# Altium footprint library CONN_HDR_2.54MM_RA.PcbLib: 63 footprints (part 3 of 5)
Each footprint in its own frame and in the unit in brackets; x right, y up, seen from the top. Pads: shape width x height; smd on the part's side, far side on the other; paste and mask are expansions set on the pad; w line width, h text height; cw(c..) or ccw(c..) is an arc to the next point about the centre after c.
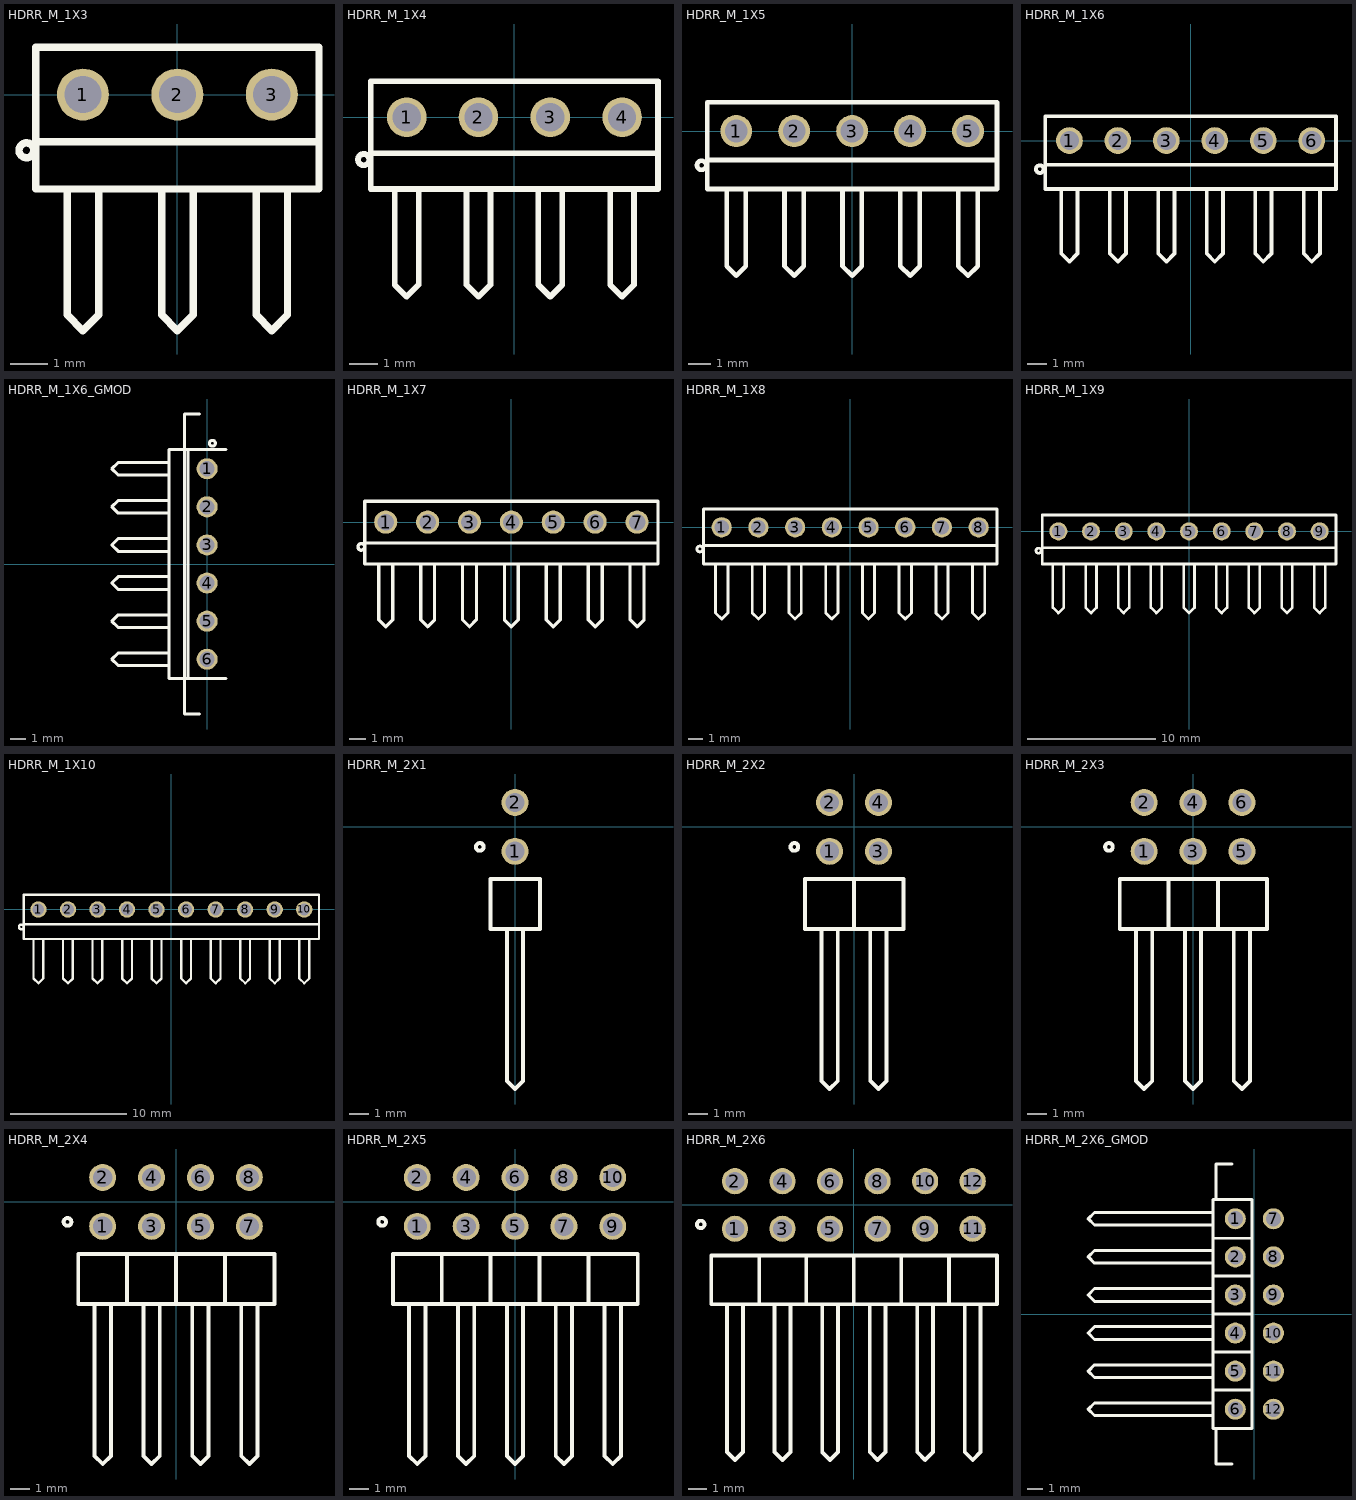
[diagram p2: the footprints below, top view; thin cyan lines are the x and y axes]

## HDRR_M_1X3 [mm] "Connector; Header; 3 Position; Right Angle"
height 12
pads (3):
  round 1.4 / inner round 1.4 / far side oval 1.4x2.2 hole 1: 1(-2.54,0) 2(0,0) 3(2.54,0)
Top Overlay:
  circle w0.2: c-4.06,-1.5 r0.2
  lines w0.2: -2.963,-2.54 -2.963,-5.927 -2.54,-6.35 -2.117,-5.927 -2.117,-2.54 ; -0.423,-2.54 -0.423,-5.927 0,-6.35 0.423,-5.927 0.423,-2.54 ; 2.117,-2.54 2.117,-5.927 2.54,-6.35 2.963,-5.927 2.963,-2.54 ; 3.81,-1.27 -3.81,-1.27 ; -3.81,-2.54 -3.81,1.27 ; -3.81,-2.54 3.81,-2.54 3.81,1.27 -3.81,1.27 ; -3.81,-2.54 -3.81,-1.27 ; -3.81,-1.27 -3.81,1.27
3D body "PLS-1R.step": height 5.45, standoff -3, extent 1.27,-7.35 3.81,1.27
3D body "PLS-1R.step": height 5.45, standoff -3, extent -1.27,-7.35 1.27,1.27
3D body "PLS-1R.step": height 5.45, standoff -3, extent -3.81,-7.35 -1.27,1.27

## HDRR_M_1X4 [mm] "Connector; Header; 4 Position; Right Angle"
height 12
pads (4):
  round 1.4 / inner round 1.4 / far side oval 1.4x2.2 hole 1: 1(-3.81,0) 2(-1.27,0) 3(1.27,0) 4(3.81,0)
Top Overlay:
  circle w0.2: c-5.33,-1.5 r0.2
  lines w0.2: -4.233,-2.54 -4.233,-5.927 -3.81,-6.35 -3.387,-5.927 -3.387,-2.54 ; -1.693,-2.54 -1.693,-5.927 -1.27,-6.35 -0.847,-5.927 -0.847,-2.54 ; 0.847,-2.54 0.847,-5.927 1.27,-6.35 1.693,-5.927 1.693,-2.54 ; 3.387,-2.54 3.387,-5.927 3.81,-6.35 4.233,-5.927 4.233,-2.54 ; -5.08,-1.27 -5.08,1.27 5.08,1.27 5.08,-1.27 ; -5.08,-1.27 5.08,-1.27 ; -5.08,-1.27 5.08,-1.27 ; -5.08,-1.27 -5.08,-2.54 5.08,-2.54 5.08,-1.27
3D body "PLS-1R.step": height 5.45, standoff -3, extent -5.08,-7.35 -2.54,1.27
3D body "PLS-1R.step": height 5.45, standoff -3, extent -2.54,-7.35 0,1.27
3D body "PLS-1R.step": height 5.45, standoff -3, extent 0,-7.35 2.54,1.27
3D body "PLS-1R.step": height 5.45, standoff -3, extent 2.54,-7.35 5.08,1.27

## HDRR_M_1X5 [mm] "Connector; Header; 5 Position"
pads (5):
  round 1.4 / inner round 1.4 / far side oval 1.4x2.2 hole 1 mask+0.1: 1(-5.08,0) 2(-2.54,0) 3(0,0) 4(2.54,0) 5(5.08,0)
Top Overlay:
  circle w0.2: c-6.6,-1.5 r0.2
  lines w0.2: -5.503,-2.54 -5.503,-5.927 -5.08,-6.35 -4.657,-5.927 -4.657,-2.54 ; -2.963,-2.54 -2.963,-5.927 -2.54,-6.35 -2.117,-5.927 -2.117,-2.54 ; -0.423,-2.54 -0.423,-5.927 0,-6.35 0.423,-5.927 0.423,-2.54 ; 2.117,-2.54 2.117,-5.927 2.54,-6.35 2.963,-5.927 2.963,-2.54 ; 4.657,-2.54 4.657,-5.927 5.08,-6.35 5.503,-5.927 5.503,-2.54 ; 6.35,-1.27 -6.35,-1.27 ; -6.35,-2.54 -6.35,1.27 ; -6.35,-2.54 6.35,-2.54 6.35,1.27 -6.35,1.27 ; -6.35,-2.54 -6.35,-1.27 ; -6.35,-1.27 -6.35,1.27
3D body "PLS-1R.step": height 5.45, standoff -3, extent 3.81,-7.35 6.35,1.27
3D body "PLS-1R.step": height 5.45, standoff -3, extent 1.27,-7.35 3.81,1.27
3D body "PLS-1R.step": height 5.45, standoff -3, extent -1.27,-7.35 1.27,1.27
3D body "PLS-1R.step": height 5.45, standoff -3, extent -3.81,-7.35 -1.27,1.27
3D body "PLS-1R.step": height 5.45, standoff -3, extent -6.35,-7.35 -3.81,1.27

## HDRR_M_1X6 [mm] "Connector; Header; 6 Position"
pads (6):
  round 1.4 / inner round 1.4 / far side oval 1.4x2.2 hole 1 mask+0.1: 1(-6.35,0) 2(-3.81,0) 3(-1.27,0) 4(1.27,0) 5(3.81,0) 6(6.35,0)
Top Overlay:
  circle w0.2: c-7.9,-1.5 r0.2
  lines w0.2: -6.773,-2.54 -6.773,-5.927 -6.35,-6.35 -5.927,-5.927 -5.927,-2.54 ; -4.233,-2.54 -4.233,-5.927 -3.81,-6.35 -3.387,-5.927 -3.387,-2.54 ; -1.693,-2.54 -1.693,-5.927 -1.27,-6.35 -0.847,-5.927 -0.847,-2.54 ; 0.847,-2.54 0.847,-5.927 1.27,-6.35 1.693,-5.927 1.693,-2.54 ; 3.387,-2.54 3.387,-5.927 3.81,-6.35 4.233,-5.927 4.233,-2.54 ; 5.927,-2.54 5.927,-5.927 6.35,-6.35 6.773,-5.927 6.773,-2.54 ; -7.62,-1.27 -7.62,1.27 7.62,1.27 7.62,-1.27 ; -7.62,-1.27 7.62,-1.27 ; -7.62,-1.27 -7.62,-2.54 7.62,-2.54 7.62,-1.27
3D body "PLS-1R.step": height 5.45, standoff -3, extent 5.08,-7.35 7.62,1.27
3D body "PLS-1R.step": height 5.45, standoff -3, extent 2.54,-7.35 5.08,1.27
3D body "PLS-1R.step": height 5.45, standoff -3, extent 0,-7.35 2.54,1.27
3D body "PLS-1R.step": height 5.45, standoff -3, extent -2.54,-7.35 0,1.27
3D body "PLS-1R.step": height 5.45, standoff -3, extent -5.08,-7.35 -2.54,1.27
3D body "PLS-1R.step": height 5.45, standoff -3, extent -7.62,-7.35 -5.08,1.27

## HDRR_M_1X6_GMOD [mm] "Connector; Header; 6 Position"
pads (6):
  round 1.4 / inner round 1.4 / far side oval 2x1.4 hole 1 mask+0.1: 1(0,6.35) 2(0,3.81) 3(0,1.27) 4(0,-1.27) 5(0,-3.81) 6(0,-6.35)
Top Overlay:
  circle w0.2: c0.35,8.05 r0.2
  lines w0.2: -2.54,-6.773 -5.927,-6.773 -6.35,-6.35 -5.927,-5.927 -2.54,-5.927 ; -2.54,-4.233 -5.927,-4.233 -6.35,-3.81 -5.927,-3.387 -2.54,-3.387 ; -2.54,-1.693 -5.927,-1.693 -6.35,-1.27 -5.927,-0.847 -2.54,-0.847 ; -2.54,0.847 -5.927,0.847 -6.35,1.27 -5.927,1.693 -2.54,1.693 ; -2.54,3.387 -5.927,3.387 -6.35,3.81 -5.927,4.233 -2.54,4.233 ; -2.54,5.927 -5.927,5.927 -6.35,6.35 -5.927,6.773 -2.54,6.773 ; -0.5,-10 -1.5,-10 -1.5,10 -0.5,10 ; 1.27,-7.62 -1.27,-7.62 ; 1.27,7.62 -1.27,7.62 ; -1.27,-7.62 -1.27,7.62 ; -1.27,-7.62 -2.54,-7.62 -2.54,7.62 -1.27,7.62
3D body "PLS-1R.step": height 5.45, standoff -3, extent -7.358,-7.62 1.262,-5.08
3D body "PLS-1R.step": height 5.45, standoff -3, extent -7.358,-5.08 1.262,-2.54
3D body "PLS-1R.step": height 5.45, standoff -3, extent -7.358,0 1.262,2.54
3D body "PLS-1R.step": height 5.45, standoff -3, extent -7.358,-2.54 1.262,0
3D body "PLS-1R.step": height 5.45, standoff -3, extent -7.358,2.54 1.262,5.08
3D body "PLS-1R.step": height 5.45, standoff -3, extent -7.358,5.08 1.262,7.62

## HDRR_M_1X7 [mm] "Connector; Header; 7 Position"
pads (7):
  round 1.4 / inner round 1.4 / far side oval 1.4x2.2 hole 1 mask+0.1: 1(-7.62,0) 2(-5.08,0) 3(-2.54,0) 4(0,0) 5(2.54,0) 6(5.08,0) 7(7.62,0)
Top Overlay:
  circle w0.2: c-9.1,-1.5 r0.2
  lines w0.2: -8.043,-2.54 -8.043,-5.927 -7.62,-6.35 -7.197,-5.927 -7.197,-2.54 ; -5.503,-2.54 -5.503,-5.927 -5.08,-6.35 -4.657,-5.927 -4.657,-2.54 ; -2.963,-2.54 -2.963,-5.927 -2.54,-6.35 -2.117,-5.927 -2.117,-2.54 ; -0.423,-2.54 -0.423,-5.927 0,-6.35 0.423,-5.927 0.423,-2.54 ; 2.117,-2.54 2.117,-5.927 2.54,-6.35 2.963,-5.927 2.963,-2.54 ; 4.657,-2.54 4.657,-5.927 5.08,-6.35 5.503,-5.927 5.503,-2.54 ; 7.197,-2.54 7.197,-5.927 7.62,-6.35 8.043,-5.927 8.043,-2.54 ; 8.89,-1.27 -8.89,-1.27 ; -8.89,-2.54 -8.89,-1.27 ; -8.89,-2.54 8.89,-2.54 8.89,1.27 -8.89,1.27 ; -8.89,-2.54 -8.89,1.27 ; -8.89,-1.27 -8.89,1.27
3D body "PLS-1R.step": height 5.45, standoff -3, extent 6.35,-7.35 8.89,1.27
3D body "PLS-1R.step": height 5.45, standoff -3, extent 3.81,-7.35 6.35,1.27
3D body "PLS-1R.step": height 5.45, standoff -3, extent 1.27,-7.35 3.81,1.27
3D body "PLS-1R.step": height 5.45, standoff -3, extent -1.27,-7.35 1.27,1.27
3D body "PLS-1R.step": height 5.45, standoff -3, extent -3.81,-7.35 -1.27,1.27
3D body "PLS-1R.step": height 5.45, standoff -3, extent -6.35,-7.35 -3.81,1.27
3D body "PLS-1R.step": height 5.45, standoff -3, extent -8.89,-7.35 -6.35,1.27

## HDRR_M_1X8 [mm] "Connector; Header; 8 Position"
pads (8):
  round 1.4 / inner round 1.4 / far side oval 1.4x2.2 hole 1 mask+0.1: 1(-8.89,0) 2(-6.35,0) 3(-3.81,0) 4(-1.27,0) 5(1.27,0) 6(3.81,0) 7(6.35,0) 8(8.89,0)
Top Overlay:
  circle w0.2: c-10.4,-1.5 r0.2
  lines w0.2: -9.313,-2.54 -9.313,-5.927 -8.89,-6.35 -8.467,-5.927 -8.467,-2.54 ; -6.773,-2.54 -6.773,-5.927 -6.35,-6.35 -5.927,-5.927 -5.927,-2.54 ; -4.233,-2.54 -4.233,-5.927 -3.81,-6.35 -3.387,-5.927 -3.387,-2.54 ; -1.693,-2.54 -1.693,-5.927 -1.27,-6.35 -0.847,-5.927 -0.847,-2.54 ; 0.847,-2.54 0.847,-5.927 1.27,-6.35 1.693,-5.927 1.693,-2.54 ; 3.387,-2.54 3.387,-5.927 3.81,-6.35 4.233,-5.927 4.233,-2.54 ; 5.927,-2.54 5.927,-5.927 6.35,-6.35 6.773,-5.927 6.773,-2.54 ; 8.467,-2.54 8.467,-5.927 8.89,-6.35 9.313,-5.927 9.313,-2.54 ; -10.16,-1.27 -10.16,-2.54 10.16,-2.54 10.16,-1.27 ; -10.16,-1.27 10.16,-1.27 ; -10.16,-1.27 -10.16,1.27 10.16,1.27 10.16,-1.27
3D body "PLS-1R.step": height 5.45, standoff -3, extent 7.62,-7.35 10.16,1.27
3D body "PLS-1R.step": height 5.45, standoff -3, extent 5.08,-7.35 7.62,1.27
3D body "PLS-1R.step": height 5.45, standoff -3, extent 2.54,-7.35 5.08,1.27
3D body "PLS-1R.step": height 5.45, standoff -3, extent 0,-7.35 2.54,1.27
3D body "PLS-1R.step": height 5.45, standoff -3, extent -2.54,-7.35 0,1.27
3D body "PLS-1R.step": height 5.45, standoff -3, extent -5.08,-7.35 -2.54,1.27
3D body "PLS-1R.step": height 5.45, standoff -3, extent -7.62,-7.35 -5.08,1.27
3D body "PLS-1R.step": height 5.45, standoff -3, extent -10.16,-7.35 -7.62,1.27

## HDRR_M_1X9 [mm] "Connector; Header; 9 Position"
pads (9):
  round 1.4 / inner round 1.4 / far side oval 1.4x2.2 hole 1 mask+0.1: 1(-10.16,0) 2(-7.62,0) 3(-5.08,0) 4(-2.54,0) 5(0,0) 6(2.54,0) 7(5.08,0) 8(7.62,0) 9(10.16,0)
Top Overlay:
  circle w0.2: c-11.7,-1.5 r0.2
  lines w0.2: -10.583,-2.54 -10.583,-5.927 -10.16,-6.35 -9.737,-5.927 -9.737,-2.54 ; -8.043,-2.54 -8.043,-5.927 -7.62,-6.35 -7.197,-5.927 -7.197,-2.54 ; -5.503,-2.54 -5.503,-5.927 -5.08,-6.35 -4.657,-5.927 -4.657,-2.54 ; -2.963,-2.54 -2.963,-5.927 -2.54,-6.35 -2.117,-5.927 -2.117,-2.54 ; -0.423,-2.54 -0.423,-5.927 0,-6.35 0.423,-5.927 0.423,-2.54 ; 2.117,-2.54 2.117,-5.927 2.54,-6.35 2.963,-5.927 2.963,-2.54 ; 4.657,-2.54 4.657,-5.927 5.08,-6.35 5.503,-5.927 5.503,-2.54 ; 7.197,-2.54 7.197,-5.927 7.62,-6.35 8.043,-5.927 8.043,-2.54 ; 9.737,-2.54 9.737,-5.927 10.16,-6.35 10.583,-5.927 10.583,-2.54 ; 11.43,-1.27 -11.43,-1.27 ; -11.43,-2.54 -11.43,-1.27 ; -11.43,-2.54 11.43,-2.54 11.43,1.27 -11.43,1.27 ; -11.43,-2.54 -11.43,1.27 ; -11.43,-1.27 -11.43,1.27
3D body "PLS-1R.step": height 5.45, standoff -3, extent 8.89,-7.35 11.43,1.27
3D body "PLS-1R.step": height 5.45, standoff -3, extent 6.35,-7.35 8.89,1.27
3D body "PLS-1R.step": height 5.45, standoff -3, extent 3.81,-7.35 6.35,1.27
3D body "PLS-1R.step": height 5.45, standoff -3, extent 1.27,-7.35 3.81,1.27
3D body "PLS-1R.step": height 5.45, standoff -3, extent -1.27,-7.35 1.27,1.27
3D body "PLS-1R.step": height 5.45, standoff -3, extent -3.81,-7.35 -1.27,1.27
3D body "PLS-1R.step": height 5.45, standoff -3, extent -6.35,-7.35 -3.81,1.27
3D body "PLS-1R.step": height 5.45, standoff -3, extent -8.89,-7.35 -6.35,1.27
3D body "PLS-1R.step": height 5.45, standoff -3, extent -11.43,-7.35 -8.89,1.27

## HDRR_M_1X10 [mm] "Connector; Header; 10 Position"
pads (10):
  round 1.4 / inner round 1.4 / far side oval 1.4x2.2 hole 1 mask+0.1: 1(-11.43,0) 2(-8.89,0) 3(-6.35,0) 4(-3.81,0) 5(-1.27,0) 6(1.27,0) 7(3.81,0) 8(6.35,0) 9(8.89,0) 10(11.43,0)
Top Overlay:
  circle w0.2: c-12.9,-1.5 r0.2
  lines w0.2: -11.853,-2.54 -11.853,-5.927 -11.43,-6.35 -11.007,-5.927 -11.007,-2.54 ; -9.313,-2.54 -9.313,-5.927 -8.89,-6.35 -8.467,-5.927 -8.467,-2.54 ; -6.773,-2.54 -6.773,-5.927 -6.35,-6.35 -5.927,-5.927 -5.927,-2.54 ; -4.233,-2.54 -4.233,-5.927 -3.81,-6.35 -3.387,-5.927 -3.387,-2.54 ; -1.693,-2.54 -1.693,-5.927 -1.27,-6.35 -0.847,-5.927 -0.847,-2.54 ; 0.847,-2.54 0.847,-5.927 1.27,-6.35 1.693,-5.927 1.693,-2.54 ; 3.387,-2.54 3.387,-5.927 3.81,-6.35 4.233,-5.927 4.233,-2.54 ; 5.927,-2.54 5.927,-5.927 6.35,-6.35 6.773,-5.927 6.773,-2.54 ; 8.467,-2.54 8.467,-5.927 8.89,-6.35 9.313,-5.927 9.313,-2.54 ; 11.007,-2.54 11.007,-5.927 11.43,-6.35 11.853,-5.927 11.853,-2.54 ; -12.7,-1.27 -12.7,-2.54 12.7,-2.54 12.7,-1.27 ; -12.7,-1.27 12.7,-1.27 ; -12.7,-1.27 -12.7,1.27 12.7,1.27 12.7,-1.27
3D body "PLS-1R.step": height 5.45, standoff -3, extent -7.62,-7.35 -5.08,1.27
3D body "PLS-1R.step": height 5.45, standoff -3, extent -10.16,-7.35 -7.62,1.27
3D body "PLS-1R.step": height 5.45, standoff -3, extent -12.7,-7.35 -10.16,1.27
3D body "PLS-1R.step": height 5.45, standoff -3, extent -5.08,-7.35 -2.54,1.27
3D body "PLS-1R.step": height 5.45, standoff -3, extent -2.54,-7.35 0,1.27
3D body "PLS-1R.step": height 5.45, standoff -3, extent 0,-7.35 2.54,1.27
3D body "PLS-1R.step": height 5.45, standoff -3, extent 2.54,-7.35 5.08,1.27
3D body "PLS-1R.step": height 5.45, standoff -3, extent 5.08,-7.35 7.62,1.27
3D body "PLS-1R.step": height 5.45, standoff -3, extent 7.62,-7.35 10.16,1.27
3D body "PLS-1R.step": height 5.45, standoff -3, extent 10.16,-7.35 12.7,1.27

## HDRR_M_2X1 [mm] "Connector; Header; 2x2 Position"
height 7
pads (2):
  round 1.4 / inner round 1.4 / far side oval 1.4x2.2 hole 1: 1(0,-1.27) 2(0,1.27)
Top Overlay:
  circle w0.2: c-1.83,-1.04 r0.2
  lines w0.2: -0.423,-5.31 -0.423,-13.197 0,-13.62 0.423,-13.197 0.423,-5.31 ; -1.27,-5.31 1.3,-5.31 1.3,-2.7 -1.27,-2.7 -1.27,-5.31
3D body "2x1 Male Pin Header Angle.STEP": height 5.04, standoff -2.96, extent -1.275,-13.34 1.27,1.56

## HDRR_M_2X2 [mm] "Connector; Header; 2x2 Position"
height 7
pads (4):
  round 1.4 / inner round 1.4 / far side oval 1.4x2.2 hole 1: 1(-1.27,-1.27) 2(-1.27,1.27) 3(1.27,-1.27) 4(1.27,1.27)
Top Overlay:
  circle w0.2: c-3.1,-1.04 r0.2
  lines w0.2: -1.693,-5.31 -1.693,-13.197 -1.27,-13.62 -0.847,-13.197 -0.847,-5.31 ; 0.03,-5.31 -2.54,-5.31 -2.54,-2.7 0.03,-2.7 ; 0.847,-5.31 0.847,-13.197 1.27,-13.62 1.693,-13.197 1.693,-5.31 ; 0,-5.31 0,-2.7 2.57,-2.7 2.57,-5.31 0,-5.31
3D body "2x1 Male Pin Header Angle.STEP": height 5.04, standoff -2.96, extent -0.005,-13.34 2.54,1.56
3D body "2x1 Male Pin Header Angle.STEP": height 5.04, standoff -2.96, extent -2.545,-13.34 0,1.56

## HDRR_M_2X3 [mm] "Connector; Header; 3x2 Position"
height 7
pads (6):
  round 1.4 / inner round 1.4 / far side oval 1.4x2.2 hole 1: 1(-2.54,-1.27) 2(-2.54,1.27) 3(0,-1.27) 4(0,1.27) 5(2.54,-1.27) 6(2.54,1.27)
Top Overlay:
  circle w0.2: c-4.37,-1.04 r0.2
  lines w0.2: -2.963,-5.31 -2.963,-13.197 -2.54,-13.62 -2.117,-13.197 -2.117,-5.31 ; -1.24,-5.31 -3.81,-5.31 -3.81,-2.7 -1.24,-2.7 ; -0.423,-5.31 -0.423,-13.197 0,-13.62 0.423,-13.197 0.423,-5.31 ; 1.27,-5.31 3.84,-5.31 3.84,-2.7 1.27,-2.7 ; 2.117,-5.31 2.117,-13.197 2.54,-13.62 2.963,-13.197 2.963,-5.31 ; -1.27,-5.31 -1.27,-2.7 1.3,-2.7 1.3,-5.31 -1.27,-5.31
3D body "2x1 Male Pin Header Angle.STEP": height 5.04, standoff -2.96, extent 1.265,-13.34 3.81,1.56
3D body "2x1 Male Pin Header Angle.STEP": height 5.04, standoff -2.96, extent -1.275,-13.34 1.27,1.56
3D body "2x1 Male Pin Header Angle.STEP": height 5.04, standoff -2.96, extent -3.815,-13.34 -1.27,1.56

## HDRR_M_2X4 [mm] "Connector; Header; 4x2 Position"
height 7
pads (8):
  round 1.4 / inner round 1.4 / far side oval 1.4x2.2 hole 1: 1(-3.81,-1.27) 2(-3.81,1.27) 3(-1.27,-1.27) 4(-1.27,1.27) 5(1.27,-1.27) 6(1.27,1.27) 7(3.81,-1.27) 8(3.81,1.27)
Top Overlay:
  circle w0.2: c-5.64,-1.04 r0.2
  lines w0.2: -4.233,-5.31 -4.233,-13.197 -3.81,-13.62 -3.387,-13.197 -3.387,-5.31 ; -2.51,-5.31 -5.08,-5.31 -5.08,-2.7 -2.51,-2.7 ; -1.693,-5.31 -1.693,-13.197 -1.27,-13.62 -0.847,-13.197 -0.847,-5.31 ; 0.03,-5.31 -2.54,-5.31 -2.54,-2.7 0.03,-2.7 ; 0.847,-5.31 0.847,-13.197 1.27,-13.62 1.693,-13.197 1.693,-5.31 ; 2.57,-5.31 0,-5.31 0,-2.7 2.57,-2.7 ; 3.387,-5.31 3.387,-13.197 3.81,-13.62 4.233,-13.197 4.233,-5.31 ; 2.54,-5.31 2.54,-2.7 5.11,-2.7 5.11,-5.31 2.54,-5.31
3D body "2x1 Male Pin Header Angle.STEP": height 5.04, standoff -2.96, extent 2.535,-13.34 5.08,1.56
3D body "2x1 Male Pin Header Angle.STEP": height 5.04, standoff -2.96, extent -0.005,-13.34 2.54,1.56
3D body "2x1 Male Pin Header Angle.STEP": height 5.04, standoff -2.96, extent -2.545,-13.34 0,1.56
3D body "2x1 Male Pin Header Angle.STEP": height 5.04, standoff -2.96, extent -5.085,-13.34 -2.54,1.56

## HDRR_M_2X5 [mm] "Connector; Header; 5x2 Position"
height 7
pads (10):
  round 1.4 / inner round 1.4 / far side oval 1.4x2.2 hole 1: 1(-5.08,-1.27) 2(-5.08,1.27) 3(-2.54,-1.27) 4(-2.54,1.27) 5(0,-1.27) 6(0,1.27) 7(2.54,-1.27) 8(2.54,1.27) 9(5.08,-1.27) 10(5.08,1.27)
Top Overlay:
  circle w0.2: c-6.91,-1.04 r0.2
  lines w0.2: -5.503,-5.31 -5.503,-13.197 -5.08,-13.62 -4.657,-13.197 -4.657,-5.31 ; -3.78,-5.31 -6.35,-5.31 -6.35,-2.7 -3.78,-2.7 ; -2.963,-5.31 -2.963,-13.197 -2.54,-13.62 -2.117,-13.197 -2.117,-5.31 ; -1.24,-5.31 -3.81,-5.31 -3.81,-2.7 -1.24,-2.7 ; -0.423,-5.31 -0.423,-13.197 0,-13.62 0.423,-13.197 0.423,-5.31 ; 1.3,-5.31 -1.27,-5.31 -1.27,-2.7 1.3,-2.7 ; 2.117,-5.31 2.117,-13.197 2.54,-13.62 2.963,-13.197 2.963,-5.31 ; 3.84,-5.31 1.27,-5.31 1.27,-2.7 3.84,-2.7 ; 4.657,-5.31 4.657,-13.197 5.08,-13.62 5.503,-13.197 5.503,-5.31 ; 3.81,-5.31 3.81,-2.7 6.38,-2.7 6.38,-5.31 3.81,-5.31
3D body "2x1 Male Pin Header Angle.STEP": height 5.04, standoff -2.96, extent 3.805,-13.34 6.35,1.56
3D body "2x1 Male Pin Header Angle.STEP": height 5.04, standoff -2.96, extent 1.265,-13.34 3.81,1.56
3D body "2x1 Male Pin Header Angle.STEP": height 5.04, standoff -2.96, extent -1.275,-13.34 1.27,1.56
3D body "2x1 Male Pin Header Angle.STEP": height 5.04, standoff -2.96, extent -3.815,-13.34 -1.27,1.56
3D body "2x1 Male Pin Header Angle.STEP": height 5.04, standoff -2.96, extent -6.355,-13.34 -3.81,1.56

## HDRR_M_2X6 [mm] "Connector; Header; 6x2 Position"
height 7
pads (12):
  round 1.4 / inner round 1.4 / far side oval 1.4x2.2 hole 1: 1(-6.35,-1.27) 2(-6.35,1.27) 3(-3.81,-1.27) 4(-3.81,1.27) 5(-1.27,-1.27) 6(-1.27,1.27) 7(1.27,-1.27) 8(1.27,1.27) 9(3.81,-1.27) 10(3.81,1.27) 11(6.35,-1.27) 12(6.35,1.27)
Top Overlay:
  circle w0.2: c-8.18,-1.04 r0.2
  lines w0.2: -6.773,-5.31 -6.773,-13.197 -6.35,-13.62 -5.927,-13.197 -5.927,-5.31 ; -5.08,-5.31 -2.51,-5.31 ; -5.08,-2.7 -2.51,-2.7 ; -4.233,-5.31 -4.233,-13.197 -3.81,-13.62 -3.387,-13.197 -3.387,-5.31 ; -1.693,-5.31 -1.693,-13.197 -1.27,-13.62 -0.847,-13.197 -0.847,-5.31 ; 0.03,-5.31 -2.54,-5.31 -2.54,-2.7 0.03,-2.7 ; 0.847,-5.31 0.847,-13.197 1.27,-13.62 1.693,-13.197 1.693,-5.31 ; 2.57,-5.31 0,-5.31 0,-2.7 2.57,-2.7 ; 3.387,-5.31 3.387,-13.197 3.81,-13.62 4.233,-13.197 4.233,-5.31 ; 5.11,-5.31 2.54,-5.31 2.54,-2.7 5.11,-2.7 ; 5.927,-5.31 5.927,-13.197 6.35,-13.62 6.773,-13.197 6.773,-5.31 ; -7.62,-5.31 -5.05,-5.31 -5.05,-2.7 -7.62,-2.7 -7.62,-5.31 ; 5.08,-5.31 7.65,-5.31 7.65,-2.7 5.08,-2.7 5.08,-5.31
3D body "2x1 Male Pin Header Angle.STEP": height 5.04, standoff -2.96, extent -7.625,-13.34 -5.08,1.56
3D body "2x1 Male Pin Header Angle.STEP": height 5.04, standoff -2.96, extent -5.085,-13.34 -2.54,1.56
3D body "2x1 Male Pin Header Angle.STEP": height 5.04, standoff -2.96, extent -2.545,-13.34 0,1.56
3D body "2x1 Male Pin Header Angle.STEP": height 5.04, standoff -2.96, extent -0.005,-13.34 2.54,1.56
3D body "2x1 Male Pin Header Angle.STEP": height 5.04, standoff -2.96, extent 2.535,-13.34 5.08,1.56
3D body "2x1 Male Pin Header Angle.STEP": height 5.04, standoff -2.96, extent 5.075,-13.34 7.62,1.56

## HDRR_M_2X6_GMOD [mm] "Connector; Header; 2x6 Position"
pads (12):
  round 1.4 / inner round 1.4 / far side oval 1.8x1.4 hole 1: 1(-1.27,6.35) 2(-1.27,3.81) 3(-1.27,1.27) 4(-1.27,-1.27) 5(-1.27,-3.81) 6(-1.27,-6.35) 7(1.27,6.35) 8(1.27,3.81) 9(1.27,1.27) 10(1.27,-1.27) 11(1.27,-3.81) 12(1.27,-6.35)
Top Overlay:
  lines w0.2: -2.77,-6.773 -10.657,-6.773 -11.08,-6.35 -10.657,-5.927 -2.77,-5.927 ; -2.77,-5.11 -2.77,-2.54 -0.16,-2.54 -0.16,-5.11 ; -2.77,-4.233 -10.657,-4.233 -11.08,-3.81 -10.657,-3.387 -2.77,-3.387 ; -2.77,-2.57 -2.77,0 -0.16,0 -0.16,-2.57 ; -2.77,-1.693 -10.657,-1.693 -11.08,-1.27 -10.657,-0.847 -2.77,-0.847 ; -2.77,-0.03 -2.77,2.54 -0.16,2.54 -0.16,-0.03 ; -2.77,0.847 -10.657,0.847 -11.08,1.27 -10.657,1.693 -2.77,1.693 ; -2.77,2.51 -2.77,5.08 ; -2.77,3.387 -10.657,3.387 -11.08,3.81 -10.657,4.233 -2.77,4.233 ; -2.77,5.927 -10.657,5.927 -11.08,6.35 -10.657,6.773 -2.77,6.773 ; -2.54,-7.65 -2.54,-10 -1.5,-10 ; -2.54,7.62 -2.54,10 -1.5,10 ; -0.16,2.51 -0.16,5.08 ; -2.77,-7.65 -0.16,-7.65 -0.16,-5.08 -2.77,-5.08 -2.77,-7.65 ; -2.77,5.05 -0.16,5.05 -0.16,7.62 -2.77,7.62 -2.77,5.05
3D body "2x1 Male Pin Header Angle.STEP": height 5.04, standoff -2.96, extent -10.8,-7.62 4.1,-5.075
3D body "2x1 Male Pin Header Angle.STEP": height 5.04, standoff -2.96, extent -10.8,-5.08 4.1,-2.535
3D body "2x1 Male Pin Header Angle.STEP": height 5.04, standoff -2.96, extent -10.8,-2.54 4.1,0.005
3D body "2x1 Male Pin Header Angle.STEP": height 5.04, standoff -2.96, extent -10.8,0 4.1,2.545
3D body "2x1 Male Pin Header Angle.STEP": height 5.04, standoff -2.96, extent -10.8,2.54 4.1,5.085
3D body "2x1 Male Pin Header Angle.STEP": height 5.04, standoff -2.96, extent -10.8,5.08 4.1,7.625